# Altium footprint library Crystal.PcbLib: 42 footprints (part 1 of 3)
Each footprint in its own frame and in the unit in brackets; x right, y up, seen from the top. Pads: shape width x height; smd on the part's side, far side on the other; paste and mask are expansions set on the pad; w line width, h text height; cw(c..) or ccw(c..) is an arc to the next point about the centre after c.
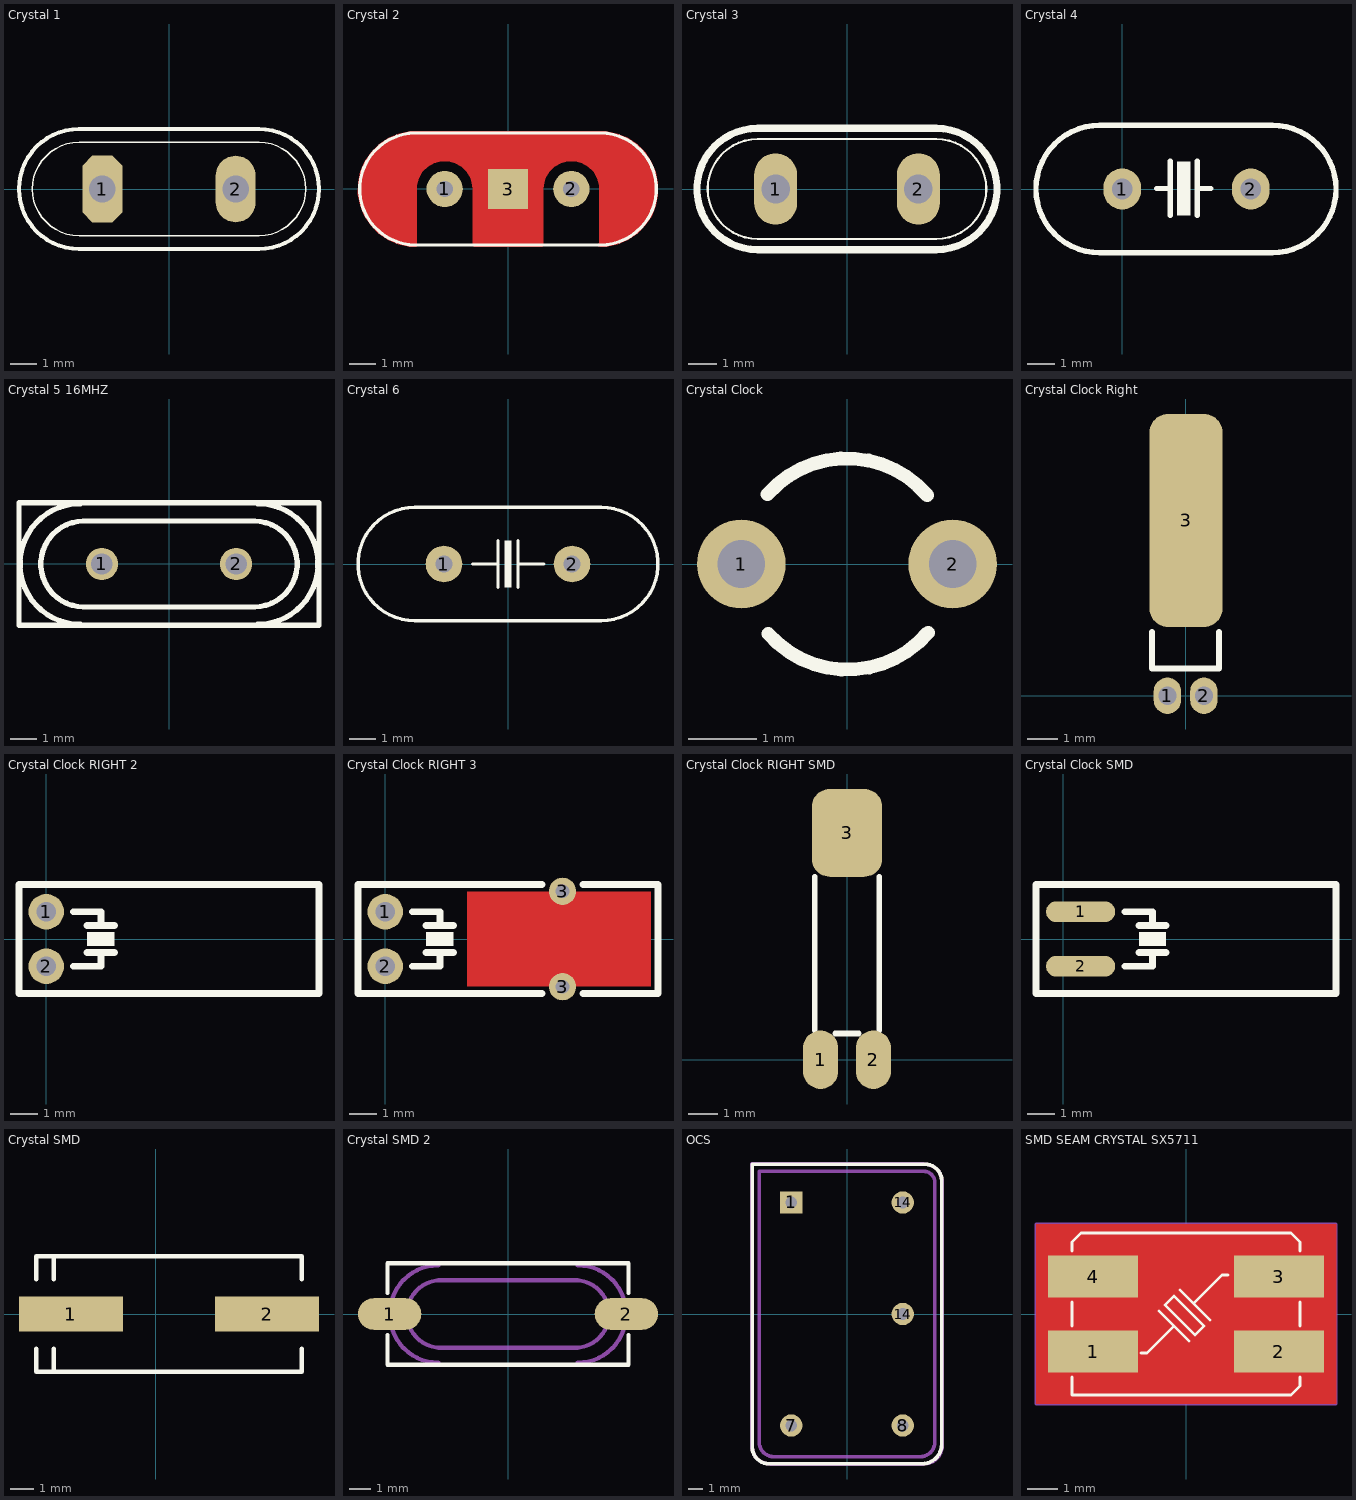
[diagram p0: the footprints below, top view; thin cyan lines are the x and y axes]

## Crystal 1 [mil]
pads (2):
  oct 60x100 hole 40: 1(-100,0)
  oval 60x100 hole 40: 2(100,0)
Top Overlay:
  lines w2: -135,-70 cw(c-135,0) -135,70 135,70 cw(c135,0) 135,-70 -135,-70
  lines w6: -135,-90 cw(c-135,0) -135,90 135,90 cw(c135,0) 135,-90 -135,-90
3D body "Crystal.STEP": height 147.64, standoff -147.64, extent -224.41,-92.52 222.44,90.55

## Crystal 2 [mil]
pads (3):
  round 55 hole 25: 1(-96.06,0) 2(96.06,0)
  rect 60x60 smd: 3(0,0)
Top Layer:
  region: -140.91,-87.51 -140.8,-87.51 -140.57,-87.51 -140.34,-87.51 -140.11,-87.52 -140,-87.52 -139.5,-87.52 -138.58,-87.13 -137.87,-86.42 -137.49,-85.5 -137.49,-85 -137.49,-84.7 -137.63,-84.11 -137.91,-83.58 -138.3,-83.12 -138.55,-82.95 -138.55,0 -138.18,5.55 -135.31,16.26 -129.77,25.86 -121.93,33.71 -112.32,39.25 -101.61,42.12 -90.52,42.12 -79.8,39.25 -70.2,33.71 -62.36,25.86 -56.81,16.26 -53.94,5.55 -53.58,0 -53.58,-84.88 -53.58,-85.38 -53.2,-86.31 -52.49,-87.01 -51.56,-87.4 -51.06,-87.4 51.06,-87.4 51.56,-87.4 52.49,-87.01 53.2,-86.31 53.58,-85.38 53.58,-84.88 53.58,0 53.94,5.55 56.81,16.26 62.36,25.86 70.2,33.71 79.8,39.25 90.52,42.12 101.61,42.12 112.32,39.25 121.93,33.71 129.77,25.86 135.31,16.26 138.18,5.55 138.55,0 138.55,-82.95 137.88,-83.42 137.35,-84.98 137.85,-86.54 139.18,-87.52 140,-87.52 140.11,-87.52 140.34,-87.51 140.57,-87.51 140.8,-87.51 140.91,-87.51 140.96,-87.51 141.05,-87.52 141.14,-87.51 141.23,-87.51 141.28,-87.51 149.82,-87.38 166.52,-83.84 182.23,-77.13 196.34,-67.51 208.33,-55.35 217.74,-41.1 224.21,-25.29 227.51,-8.54 227.51,0 227.51,8.62 224.15,25.53 217.55,41.45 207.98,55.79 195.79,67.98 181.45,77.55 165.53,84.15 148.62,87.51 140,87.52 139.86,87.52 139.57,87.48 139.3,87.42 139.03,87.32 138.9,87.26 138.77,87.32 138.5,87.42 138.22,87.48 137.94,87.52 137.8,87.52 -137.8,87.52 -137.94,87.52 -138.22,87.48 -138.5,87.42 -138.77,87.32 -138.9,87.26 -139.03,87.32 -139.3,87.42 -139.57,87.48 -139.86,87.52 -140,87.52 -148.58,87.52 -165.41,84.18 -181.27,77.65 -195.57,68.15 -207.74,56.06 -217.34,41.84 -224,26.03 -227.45,9.22 -227.58,-7.94 -224.37,-24.79 -217.95,-40.71 -208.56,-55.07 -196.56,-67.33 -182.41,-77.03 -166.64,-83.8 -149.86,-87.38 -141.28,-87.51 -141.23,-87.51 -141.14,-87.51 -141.05,-87.52 -140.96,-87.51
Top Overlay:
  lines w5: -140,-85 cw(c-140,0) -140,85 140,85 cw(c140,0) 140,-85 -140,-85
3D body "Crystal-3.8mm.STEP": height 142.13, standoff -76.77, extent -226.37,-88.58 226.38,88.59

## Crystal 3 [mil]
pads (2):
  oval 60x100 hole 40: 1(-100,0) 2(100,0)
Top Overlay:
  lines w3: -125,-70 cw(c-125,0) -125,70 125,70 cw(c125,0) 125,-70 -125,-70
  lines w10: -125,-85 cw(c-125,0) -125,85 125,85 cw(c125,0) 125,-85 -125,-85
3D body "User Library-HC49S.STEP": height 152.73, standoff -67.74, extent -218.55,-91.53 221.31,92.43

## Crystal 4 [mil]
height 590.55
pads (2):
  oval 55x60 hole 30: 1(0,0) 2(187.4,0)
Top Overlay:
  rectangle: 79.53,-38.58 99.21,40.16
  lines w7.87: 50,0.79 69.69,0.79 ; 69.69,-38.58 69.69,40.16 ; 109.06,-38.58 109.06,40.16 ; 109.06,0.79 128.74,0.79 ; -32.68,-92.91 cw(c-32.68,0) -32.68,92.91 218.5,92.91 cw(c218.5,0) 218.5,-92.91 -32.68,-92.91
3D body "Part5.STEP": height 514.25, standoff -94.02, extent -130.71,-93.7 316.14,95.28

## Crystal 5 16MHZ [mm]
height 5.08
pads (2):
  round 1.2 / inner oval 1.2x2 / far side oval 1.2x2 hole 0.8: 1(-2.5,0)
  round 1.2 / inner round 1.2 / far side oval 1.2x2 hole 0.8: 2(2.5,0)
Top Overlay:
  lines w0.2: -3.302,-2.25 cw(c-3.302,0) -3.302,2.25 ; -3.2,-1.6 3.2,-1.6 ; -3.2,1.6 3.2,1.6 ; -3.175,-1.6 cw(c-3.175,0) -3.175,1.6 ; 3.175,-1.6 ccw(c3.175,0) 3.175,1.6 ; 3.302,-2.25 ccw(c3.302,0) 3.302,2.25 ; -5.588,-2.286 5.588,-2.286 5.588,2.286 -5.588,2.286 -5.588,-2.286
3D body "HC-49_LT_THT_16MHz.step": height 3.6, standoff -1.99, extent -5.675,-2.325 5.675,2.325

## Crystal 6 [mil]
pads (2):
  round 55 hole 25: 1(-96.06,0) 2(96.06,0)
Top Overlay:
  rectangle: -5,-35 5,35
  lines w5: -53,0 -15,0 ; -15,-35 -15,35 ; 15,-35 15,35 ; 15,0 54,0 ; -140,-85 cw(c-140,0) -140,85 140,85 cw(c140,0) 140,-85 -140,-85
3D body "Crystal-3.8mm.STEP": height 142.13, standoff -76.77, extent -226.37,-88.58 226.38,88.59

## Crystal Clock [mm]
pads (2):
  round 1.3 hole 0.7: 1(-1.55,0) 2(1.55,0)
Top Overlay:
  lines w0.2: -1.165,1.022 cw(c0,0) 1.179,1.006 ; -1.155,-1.022 ccw(c0.01,0) 1.189,-1.006
3D body "Crystal 32.768.STEP": height 9.53, standoff -1.25, extent -1.65,-1.6 1.8,1.6

## Crystal Clock Right [mm] "CRYSTAL RTC SLEEP, AB26T"
height 2.3
pads (3):
  oval 0.9x1.2 hole 0.6 mask+0.1: 1(-0.6,0) 2(0.6,0)
  rrect50% 2.4x7 smd: 3(0.011,5.763)
Top Overlay:
  lines w0.2: -1.1,2.1 -1.1,0.9 1.1,0.9 1.1,2.1
3D body "User Library-DT-26-1.step": height 2, standoff -2, extent -1,-0.1 1,7.04

## Crystal Clock RIGHT 2 [mm]
pads (2):
  round 1.3 hole 0.7: 1(0,1) 2(0,-1)
Top Overlay:
  rectangle: 1.5,-0.25 2.5,0.25
  lines w0.254: 1,-1 2,-1 2,-0.5 ; 1,1 2,1 2,0.5 ; 1.5,-0.5 2.5,-0.5 ; 1.5,0.5 2.5,0.5 ; -1,-2 10,-2 10,2 -1,2 -1,-2
3D body: height 1.75, standoff 1.25, extent -0.25,-1.246 0.25,-0.754
3D body: height 1.75, standoff 1.25, extent -0.25,0.754 0.25,1.246
3D body: height 1.5, standoff -1.5, extent -0.248,-1.249 0.25,-0.75
3D body: height 1.5, standoff -1.5, extent -0.248,0.751 0.25,1.25
3D body: height 1.75, standoff 1.25, extent 0,0.751 2.5,1.249
3D body: height 1.75, standoff 1.25, extent 0,-1.248 2.5,-0.75
3D body: height 3, standoff 0, extent 2.5,-1.488 9.5,1.5

## Crystal Clock RIGHT 3 [mm]
pads (4):
  round 1.3 hole 0.7: 1(0,1) 2(0,-1)
  round 1 hole 0.5: 3(6.5,-1.75) 3(6.5,1.75)
Top Layer:
  rectangle: 3,-1.75 9.75,1.75
Top Overlay:
  rectangle: 1.5,-0.25 2.5,0.25
  lines w0.254: 1,-1 2,-1 2,-0.5 ; 1,1 2,1 2,0.5 ; 1.5,-0.5 2.5,-0.5 ; 1.5,0.5 2.5,0.5 ; 5.75,-2 -1,-2 -1,2 5.75,2 ; 7.25,-2 10,-2 10,2 7.25,2
3D body: height 1.75, standoff 1.25, extent -0.25,-1.245 0.25,-0.753
3D body: height 1.75, standoff 1.25, extent -0.25,0.755 0.25,1.247
3D body: height 1.5, standoff -1.5, extent -0.248,-1.248 0.25,-0.749
3D body: height 1.5, standoff -1.5, extent -0.248,0.752 0.25,1.251
3D body: height 1.75, standoff 1.25, extent 0,0.752 2.5,1.25
3D body: height 1.75, standoff 1.25, extent 0,-1.247 2.5,-0.749
3D body: height 3, standoff 0, extent 2.5,-1.487 9.5,1.501

## Crystal Clock RIGHT SMD [mm] "AB26TRB, AB26TRJ, AB26TRQ"
height 2.3
pads (3):
  oval 1.2x2 smd mask+0.1: 1(-0.9,0) 2(0.9,0)
  rrect50% 2.4x3 smd: 3(0,7.75)
Top Overlay:
  lines w0.2: -1.1,1 -1.1,6.25 ; -0.4,0.9 0.4,0.9 ; 1.1,1 1.1,6.25
3D body: height 0.5, standoff 0, extent -1.229,0.385 -0.737,0.885
3D body: height 0.5, standoff 0, extent 0.771,0.385 1.263,0.885
3D body: height 0.5, standoff 0, extent -1.232,-0.635 -0.734,0.635
3D body: height 0.5, standoff 0, extent 0.768,-0.635 1.266,0.635
3D body: height 1.75, standoff 1.25, extent 0.77,0.385 1.262,0.885
3D body: height 1.75, standoff 1.25, extent -1.23,0.385 -0.738,0.885
3D body: height 1.5, standoff 0.25, extent -1.234,0.387 -0.735,0.885
3D body: height 1.75, standoff 1.25, extent -1.233,0.635 -0.735,1.905
3D body: height 1.75, standoff 1.25, extent 0.767,0.635 1.265,1.905
3D body: height 3, standoff 0, extent -1.484,1.865 1.504,8.865
3D body: height 1.5, standoff 0.25, extent 0.766,0.387 1.265,0.885

## Crystal Clock SMD [mm]
pads (2):
  oval 2.54x0.762 smd: 1(0.635,1) 2(0.635,-1)
Top Overlay:
  rectangle: 2.77,-0.25 3.77,0.25
  lines w0.254: 2.27,-1 3.27,-1 3.27,-0.5 ; 2.27,1 3.27,1 3.27,0.5 ; 2.77,-0.5 3.77,-0.5 ; 2.77,0.5 3.77,0.5 ; -1,-2 -1,2 10,2 10,-2 -1,-2
3D body: height 1.5, standoff 0.25, extent 1.022,-1.249 1.52,-0.75
3D body: height 3, standoff 0, extent 2.5,-1.488 9.5,1.5
3D body: height 1.75, standoff 1.25, extent 1.27,-1.249 2.54,-0.751
3D body: height 1.75, standoff 1.25, extent 1.27,0.751 2.54,1.249
3D body: height 1.5, standoff 0.25, extent 1.022,0.751 1.52,1.25
3D body: height 1.75, standoff 1.25, extent 1.02,0.754 1.52,1.246
3D body: height 1.75, standoff 1.25, extent 1.02,-1.246 1.52,-0.754
3D body: height 0.5, standoff 0, extent 0,-1.25 1.27,-0.752
3D body: height 0.5, standoff 0, extent 0,0.75 1.27,1.248
3D body: height 0.5, standoff 0, extent 1.02,-1.247 1.52,-0.755
3D body: height 0.5, standoff 0, extent 1.02,0.753 1.52,1.245

## Crystal SMD [mm]
pads (2):
  rect 4.5x1.5 smd: 1(-3.683,0) 2(4.817,0)
Top Overlay:
  lines w0.2: -5.183,-1.5 -5.183,-2.5 6.317,-2.5 6.317,-1.5 ; -5.183,1.5 -5.183,2.5 6.317,2.5 6.317,1.5 ; -4.433,-2.5 -4.433,-1.5 ; -4.433,1.5 -4.433,2.5
3D body "User Library-HC49_SMD.STEP": height 5.18, standoff 0, extent -5.642,-2.25 6.658,2.25

## Crystal SMD 2 [mm] "SMD crystal resonator, HC-49, HC49 11X4.5MM"
pads (2):
  oval 3x1.5 smd: 1(-5.6,0) 2(5.6,0)
Top Overlay:
  lines w0.2: -5.7,-1 -5.7,-2.4 5.7,-2.4 5.7,-1 ; -5.7,1 -5.7,2.4 5.7,2.4 5.7,1
Mechanical 1:
  lines w0.2: -3.302,-2.3 cw(c-3.302,0) -3.302,2.3 ; -3.302,-1.6 3.302,-1.6 ; -3.302,1.6 3.302,1.6 ; -3.175,-1.6 cw(c-3.175,0) -3.175,1.6 ; 3.175,-1.6 ccw(c3.175,0) 3.175,1.6 ; 3.302,-2.3 ccw(c3.302,0) 3.302,2.3
3D body "User Library-Crystal HC49_US-SM.step": height 4.3, standoff 0, extent -6.4,-2.415 6.4,2.415

## OCS [mil]
pads (5):
  rect 60x60 hole 32: 1(-150,300)
  round 60 hole 32: 7(-150,-300) 8(150,-300) 14(150,0) 14(150,300)
Top Overlay:
  lines w10: -255,-358 ccw(c-210,-358) -210,-403 202,-403 ccw(c202,-350) 255,-350 255,350 255,358 ccw(c210,358) 210,403 -210,403 -255,403 -255,350 -255,-350 -255,-358
Mechanical 1:
  circle w10: c-150,-300 r10
  circle w10: c150,-300 r10
  circle w10: c150,300 r10
  circle w10: c-150,300 r10
  lines w10: -255.91,-354.33 ccw(c-206.69,-354.33) -206.69,-403.54 206.69,-403.54 ccw(c206.69,-354.33) 255.91,-354.33 255.91,354.33 ccw(c206.69,354.33) 206.69,403.54 -255.91,403.54 -255.91,-354.33 ; -236.22,-344.49 ccw(c-196.85,-344.49) -196.85,-383.86 196.85,-383.86 ccw(c196.85,-344.49) 236.22,-344.49 236.22,354.33 ccw(c206.69,354.33) 206.69,383.86 -236.22,383.86 -236.22,-344.49
3D body: height 30, standoff 0, extent -255.89,-403.52 255.89,403.52
3D body: height 170, standoff 0, extent -236.2,-383.84 236.2,383.84
3D body: height 0, standoff -50, extent -159.98,-309.98 -140.02,-290.02
3D body: height 0, standoff -50, extent 140.02,-309.98 159.98,-290.02
3D body: height 0, standoff -50, extent -159.98,290.02 -140.02,309.98
3D body: height 0, standoff -50, extent 140.02,290.02 159.98,309.98

## SMD SEAM CRYSTAL SX5711 [mm] "High frequency stability and reliability"
height 1.2
pads (4):
  rect 3x1.4 smd: 1(-3.1,-1.25) 2(3.1,-1.25) 3(3.1,1.25) 4(-3.1,1.25)
Top Layer:
  pour cut-out: -5,3 -5,-3 5,-3 5,3
Top Overlay:
  lines w0.1: -3.8,-2.1 -3.8,-2.7 3.5,-2.7 3.8,-2.4 3.8,-2.1 ; -3.8,-0.4 -3.8,0.4 ; -3.8,2.1 -3.8,2.4 -3.5,2.7 3.5,2.7 3.8,2.4 3.8,2.1 ; -1.5,-1.3 -1.3,-1.3 -0.4,-0.4 ; -0.9,0.1 0.1,-0.9 ; -0.2,0.8 0.8,-0.2 ; 0.3,0.4 1.2,1.3 1.4,1.3 ; 3.8,-0.4 3.8,0.4 ; -0.7,0.3 0.3,-0.7 0.6,-0.4 ; -0.7,0.3 -0.7,0.3 ; -0.7,0.3 -0.4,0.6 0.6,-0.4 ; 0.6,-0.4 0.6,-0.4
Mechanical 15:
  lines w0.1: -0.5,0 0.5,0 ; 0,-0.5 0,0.5 ; -5,-3 -5,3 5,3 5,-3 -5,-3
3D body "User Library-KX-13 7_0x5_0x1_3.STEP": height 1.3, standoff 0, extent -3.525,-2.5 3.475,2.5